# Altium footprint library myintlib.PcbLib: 39 footprints (part 1 of 3)
Each footprint in its own frame and in the unit in brackets; x right, y up, seen from the top. Pads: shape width x height; smd on the part's side, far side on the other; paste and mask are expansions set on the pad; w line width, h text height; cw(c..) or ccw(c..) is an arc to the next point about the centre after c.
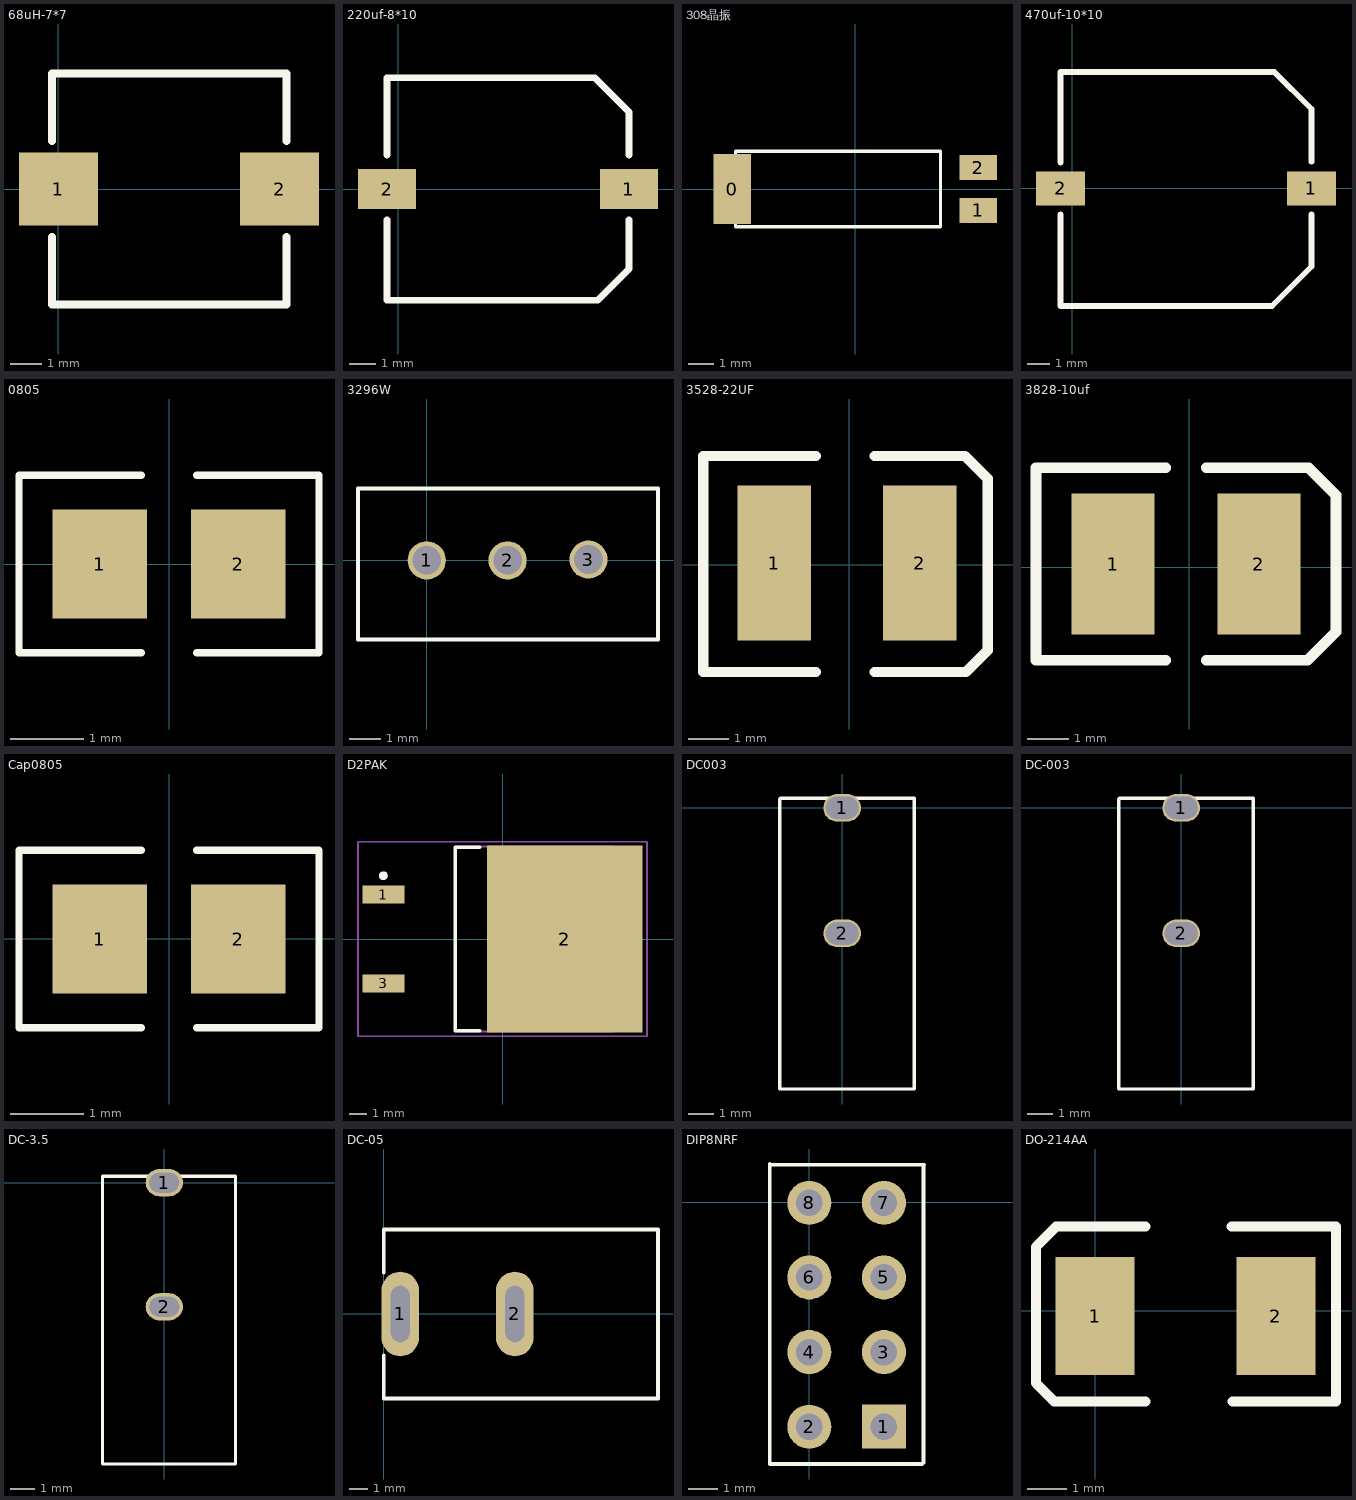
[diagram p0: the footprints below, top view; thin cyan lines are the x and y axes]

## 68uH-7*7 [mm] "功率电感"
pads (2):
  rect 2.5x2.3 smd: 1(0,0) 2(7,0)
Top Overlay:
  lines w0.254: -0.203,-1.524 -0.203,-3.658 7.214,-3.658 7.214,-1.524 ; -0.203,1.524 -0.203,3.658 7.214,3.658 7.214,1.524
3D body: height 4.55, standoff 0, extent -0.209,-3.642 7.219,3.658

## 220uf-8*10 [mm] "电解电容"
pads (2):
  rect 2.16x1.5 smd: 1(8.59,0) 2(-0.41,0)
Top Overlay:
  lines w0.254: -0.406,-1.143 -0.406,-4.14 7.417,-4.14 8.585,-2.972 8.585,-1.143 ; -0.406,1.27 -0.406,4.14 7.315,4.14 8.585,2.87 8.585,1.27
3D body: height 11.9, standoff -0.05, extent -0.41,-4.15 8.59,4.15

## 308晶振 [mm] "32.768KHz"
pads (3):
  rect 1.5x2.8 smd: 0(-4.889,0)
  rect 1.5x1 smd: 1(4.889,-0.85) 2(4.889,0.85)
Top Overlay:
  lines w0.127: -4.763,-1.5 -4.763,1.5 3.387,1.5 3.387,-1.5 -4.763,-1.5
3D body: height 3, standoff 0, extent -4.763,-1.5 3.365,1.548

## 470uf-10*10 [mm] "电解电容"
pads (2):
  rect 2.16x1.5 smd: 1(10.49,0) 2(-0.508,0)
Top Overlay:
  lines w0.254: -0.508,-1.143 -0.508,-5.156 8.763,-5.156 10.49,-3.429 10.49,-1.143 ; -0.508,1.143 -0.508,5.105 8.865,5.105 10.49,3.48 10.49,1.168
3D body: height 7.9, standoff -0.05, extent -0.496,-5.175 10.504,5.125

## 0805 [mm]
pads (2):
  rect 1.3x1.5 smd: 1(-0.95,0) 2(0.95,0)
Top Overlay:
  lines w0.1: -0.381,-1.219 -2.057,-1.219 -2.057,1.219 -0.381,1.219 ; 0.381,-1.219 2.057,-1.219 2.057,1.219 0.381,1.219
3D body: height 0.76, standoff 0, extent -1.15,-0.675 1.15,0.675

## 3296W [mm]
pads (3):
  round 1.2 hole 0.9: 1(0,0) 2(2.54,0) 3(5.08,0.025)
Top Overlay:
  lines w0.127: -2.159,-2.489 -2.159,2.261 -2.108,2.261 7.264,2.261 7.264,-2.489 -2.159,-2.489
3D body: height 11.5, standoff -4.1, extent -2.185,-2.513 7.315,2.337

## 3528-22UF [mm] "3.57mm*3.0mm*1.95mm"
pads (2):
  rect 1.8x3.8 smd: 1(-1.836,0.035) 2(1.734,0.035)
Top Overlay:
  lines w0.254: -0.813,-2.642 -3.581,-2.642 -3.581,2.667 -0.813,2.667 ; 0.635,-2.642 2.87,-2.642 3.404,-2.108 3.404,2.108 2.845,2.667 0.635,2.667
3D body: height 2.03, standoff 0, extent -1.875,-1.525 1.825,1.475

## 3828-10uf [mm] "3.5mm*2.68mm*2.03"
pads (2):
  rect 2x3.4 smd: 1(-1.829,0.076) 2(1.676,0.076)
Top Overlay:
  lines w0.254: -0.559,-2.235 -3.683,-2.235 -3.683,2.388 -0.559,2.388 ; 0.406,-2.235 2.845,-2.235 3.531,-1.549 3.531,1.727 2.87,2.388 0.406,2.388
3D body: height 2.03, standoff 0, extent -2.078,-1.264 1.622,1.416

## Cap0805 [mm] "贴片电容"
pads (2):
  rect 1.3x1.5 smd: 1(-0.95,0) 2(0.95,0)
Top Overlay:
  lines w0.1: -0.381,-1.219 -2.057,-1.219 -2.057,1.219 -0.381,1.219 ; 0.381,-1.219 2.057,-1.219 2.057,1.219 0.381,1.219
3D body: height 0.78, standoff 0, extent -1,-0.625 1,0.625

## D2PAK [mm] "TO-263-3"
pads (3):
  rect 2.4x1.05 smd: 1(-6.8,2.54) 3(-6.8,-2.54)
  rect 8.9x10.65 smd: 2(3.55,0)
Top Overlay:
  circle w0.25: c-6.8,3.615 r0.125
  lines w0.2: -1.3,-5.25 -2.7,-5.25 -2.7,5.25 -1.3,5.25
Mechanical 13:
  lines w0.1: -2.7,-5.275 -2.7,5.275 6.3,5.275 6.3,-5.275 -2.7,-5.275
Mechanical 15:
  lines w0.1: -0.5,0 0.5,0 ; 0,-0.5 0,0.5 ; -8.25,-5.55 -8.25,5.55 8.25,5.55 8.25,-5.55 -8.25,-5.55
3D body: height -0.41, standoff -5.43, extent -7.714,-5.131 7.549,5.029

## DC003 [mm]
pads (2):
  oval 1.5x1.1 hole 0.9 slot 1.3 at 0 deg: 1(0,0) 2(0,-5)
Top Overlay:
  lines w0.127: -2.489,-11.201 -2.489,0.356 -2.464,0.381 2.87,0.381 2.87,-11.201 -2.489,-11.201
3D body: height 7.4, standoff -3.2, extent -2.504,-11.219 2.896,0.381

## DC-003 [mm]
pads (2):
  oval 1.5x1.1 hole 0.9 slot 1.3 at 0 deg: 1(0,0) 2(0,-5)
Top Overlay:
  lines w0.127: -2.489,-11.201 -2.489,0.356 -2.464,0.381 2.87,0.381 2.87,-11.201 -2.489,-11.201
3D body: height 7.4, standoff -3.2, extent -2.504,-11.219 2.896,0.381

## DC-3.5 [mm]
pads (2):
  oval 1.5x1.1 hole 0.8 slot 1.2 at 0 deg: 1(0,0) 2(0,-5)
Top Overlay:
  lines w0.127: -2.489,-11.328 2.87,-11.328 2.87,0.254 -2.489,0.254 -2.489,-11.328
3D body: height 0, standoff 0, extent -1270,-1270 -1270,-1270
3D body: height 7.4, standoff -3.2, extent -2.479,-11.346 2.921,0.254

## DC-05 [mm] "电源端子"
pads (2):
  oval 2x4.5 hole 1 slot 3 at 90 deg: 1(0.889,0) 2(6.985,0)
Top Overlay:
  lines w0.2: 0.005,-2.2 0.005,-4.5 14.605,-4.5 14.605,4.5 6.198,4.5 0.005,4.5 0.005,2.2
3D body: height 11, standoff -4.5, extent 0.483,-4.5 15.083,4.5

## DIP8NRF [mm]
pads (8):
  rect 1.5x1.5 hole 0.9: 1(2.54,-7.645)
  round 1.5 hole 0.9: 2(0,-7.645) 3(2.54,-5.105) 4(0,-5.105) 5(2.54,-2.565) 6(0,-2.565) 7(2.54,-0.025) 8(0,-0.025)
Top Overlay:
  lines w0.127: -1.346,-8.915 -1.346,1.295 -1.321,1.27 3.912,1.27 3.886,1.245 3.886,-8.865 3.835,-8.915 -1.346,-8.915
3D body: height 11.12, standoff -2.94, extent -25.114,-8.891 3.886,6.605

## DO-214AA [mm] "肖特基二极管"
pads (2):
  rect 2x3 smd: 1(0,-0.127) 2(4.572,-0.127)
Top Overlay:
  lines w0.254: 1.27,-2.286 -1.041,-2.286 -1.499,-1.829 -1.499,1.626 -0.991,2.134 1.27,2.134 ; 3.454,2.134 4.089,2.134 6.096,2.134 6.096,-2.057 6.096,-2.286 3.48,-2.286
3D body: height 2.45, standoff 0.03, extent -0.438,-2.001 5.062,1.899